# Altium footprint library 00.PcbLib: 150 footprints (part 6 of 10)
Each footprint in its own frame and in the unit in brackets; x right, y up, seen from the top. Pads: shape width x height; smd on the part's side, far side on the other; paste and mask are expansions set on the pad; w line width, h text height; cw(c..) or ccw(c..) is an arc to the next point about the centre after c.
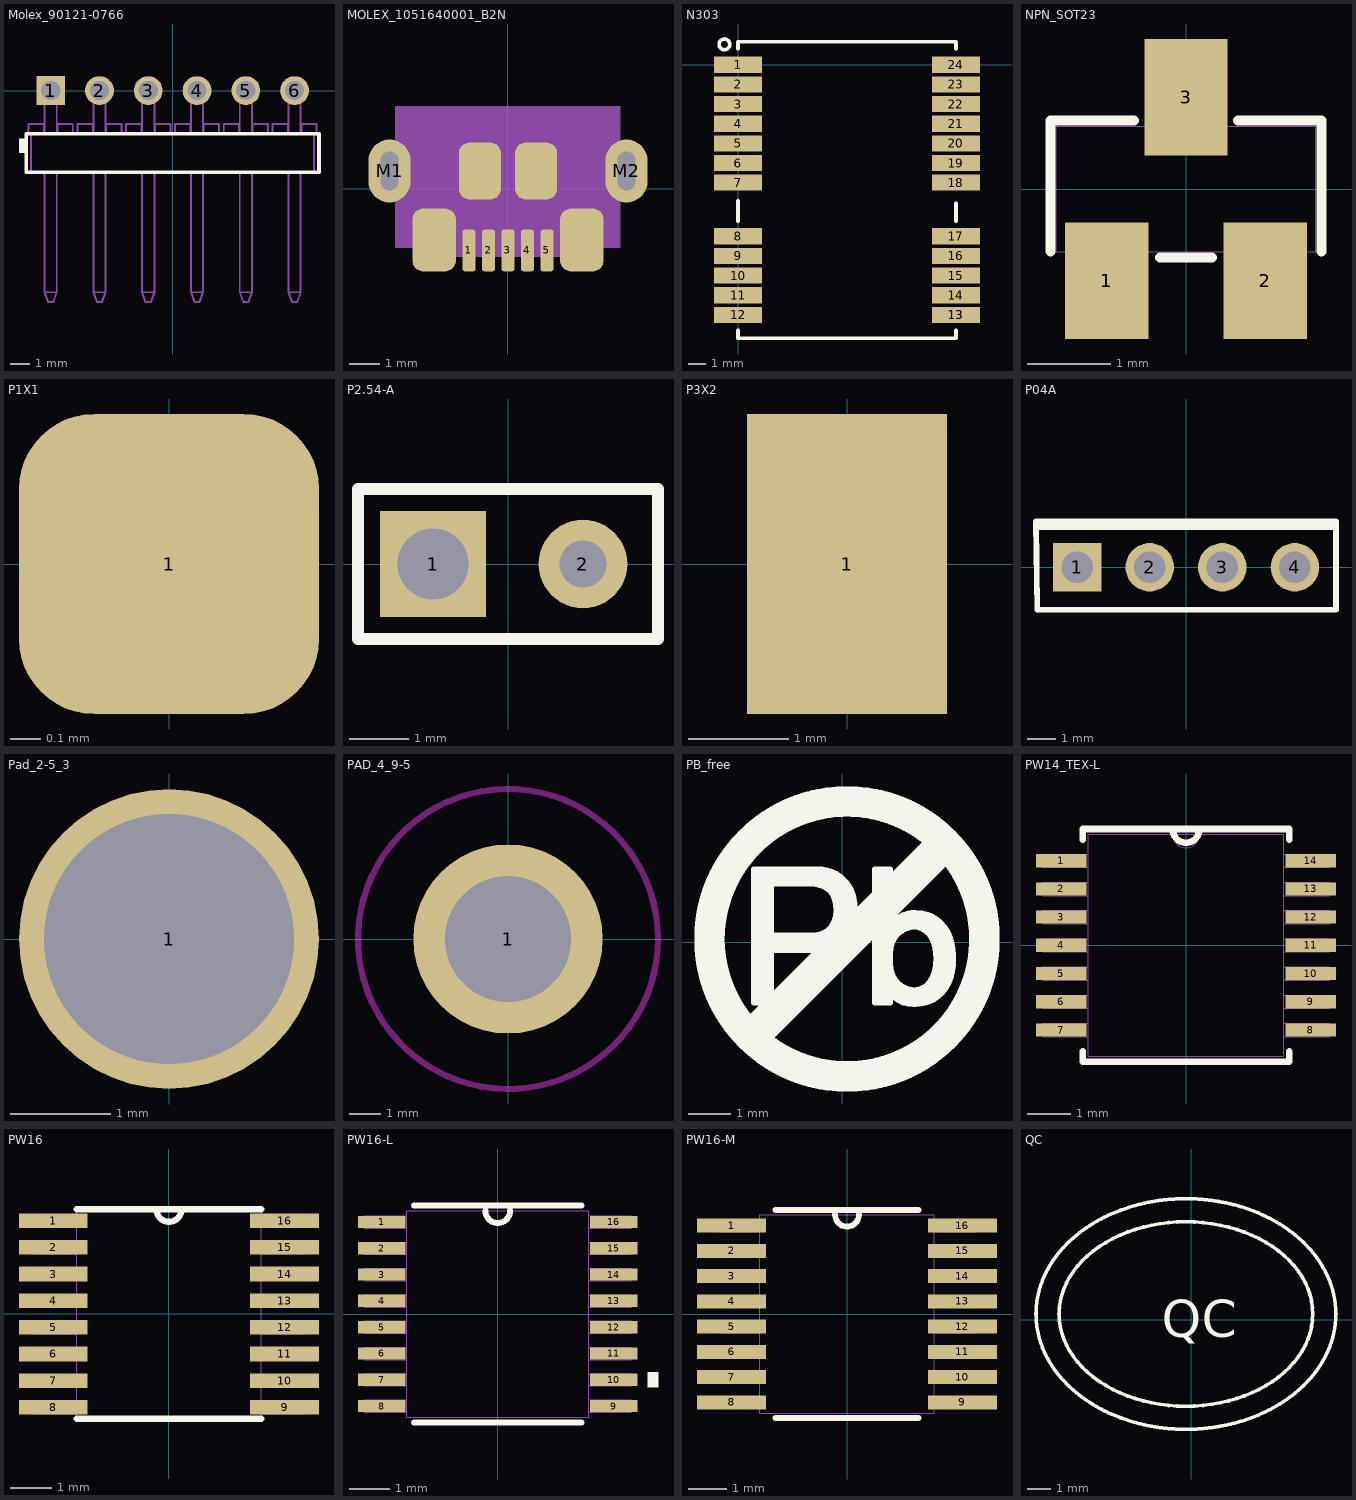
[diagram p5: the footprints below, top view; thin cyan lines are the x and y axes]

## Molex_90121-0766 [mm]
pads (6):
  rect 1.5x1.5 hole 1: 1(-6.35,0)
  round 1.5 hole 1: 2(-3.81,0) 3(-1.27,0) 4(1.27,0) 5(3.81,0) 6(6.35,0)
Top Overlay:
  rectangle: -8,-3.25 -7.62,-2.5
  lines w0.2: -7.62,-4.25 -7.37,-4.25 -5.469,-4.25 -5.175,-4.25 -4.985,-4.25 -4.691,-4.25 -2.929,-4.25 -2.635,-4.25 -2.445,-4.25 -2.151,-4.25 -0.389,-4.25 -0.095,-4.25 0.095,-4.25 0.389,-4.25 2.151,-4.25 2.445,-4.25 2.635,-4.25 2.929,-4.25 4.691,-4.25 4.985,-4.25 5.175,-4.25 5.469,-4.25 7.37,-4.25 7.62,-4.25 7.62,-2.25 -7.62,-2.25 -7.62,-4.25
Top Component Outline (Mech100):
  drawing of 200 lines, arcs and shapes, not listed
3D body "901210766.stp": height 3.63, standoff -2.87, extent -7.62,-11 7.62,0.318

## MOLEX_1051640001_B2N [mm] "MOLEX_1051640001_B2N"
pads (11):
  rrect50% 0.449x1.401 smd: 1(-1.3,-2.05) 2(-0.65,-2.05) 3(0,-2.05) 4(0.65,-2.05) 5(1.3,-2.05)
  oval 1.4x2.1 hole 1.3 slot 0.6 at 0 deg: M1(-3.95,0.6) M2(3.95,0.6)
  rrect50% 1.449x2.101 smd: ""(-2.462,-1.7) ""(2.462,-1.7)
  rrect50% 1.4x1.9 smd: ""(-0.938,0.6) ""(0.938,0.6)
Top 3D Body:
  region: 3.75,0.15 3.75,1.05 4.1,1.05 4.1,0.15
  region: 1.175,-2.4 1.175,-2.25 1.425,-2.25 1.425,-2.4
  region: 0.525,-2.4 0.525,-2.25 0.775,-2.25 0.775,-2.4
  region: -0.125,-2.4 -0.125,-2.25 0.125,-2.25 0.125,-2.4
  region: -0.775,-2.4 -0.775,-2.25 -0.525,-2.25 -0.525,-2.4
  region: -1.425,-2.4 -1.425,-2.25 -1.175,-2.25 -1.175,-2.4
  region: -4.1,0.15 -4.1,1.05 -3.75,1.05 -3.75,0.15
  region: 1.675,-2.25 1.325,-2.25 -1.325,-2.25 -1.675,-2.25 -2.175,-2.25 -2.493,-2.25 -2.846,-2.25 -3,-2.25 -3,-1.95 -3.604,-1.95 -3.75,-1.95 -3.75,2.75 -3.604,2.75 -2.846,2.75 -2.493,2.75 2.493,2.75 2.846,2.75 3.604,2.75 3.75,2.75 3.75,-1.95 3.604,-1.95 3,-1.95 3,-2.25 2.846,-2.25 2.493,-2.25 2.175,-2.25
Top Assembly:
  lines w0.025: -3.75,0.15 -4.012,0.15 -4.1,0.15 -4.1,1.05 -4.012,1.05 -3.75,1.05 ; -3,2.75 -3,-1.95 ; -2.7,-1.95 -2.7,2.75 ; -2.493,-1.95 -2.493,-2.25 ; -2.375,-1.95 -2.375,-1.45 ; -2.175,-1.95 -2.175,-2.25 ; -1.75,-1.45 -1.75,-1.25 ; -1.675,-1.85 -1.325,-1.85 ; -1.425,-2.25 -1.425,-2.4 -1.175,-2.4 -1.175,-2.25 ; -0.775,-2.25 -0.775,-2.4 -0.525,-2.4 -0.525,-2.25 ; -0.125,-2.25 -0.125,-2.4 0.125,-2.4 0.125,-2.25 ; 0.525,-2.25 0.525,-2.4 0.775,-2.4 0.775,-2.25 ; 1.175,-2.25 1.175,-2.4 1.425,-2.4 1.425,-2.25 ; 1.675,-1.85 1.325,-1.85 ; 1.75,-1.45 1.75,-1.25 ; 2.175,-1.95 2.175,-2.25 ; 2.375,-1.95 2.375,-1.45 ; 2.493,-1.95 2.493,-2.25 ; 2.7,-1.95 2.7,2.75 ; 3,2.75 3,-1.95 ; 3.75,0.15 4.012,0.15 4.1,0.15 4.1,1.05 4.012,1.05 3.75,1.05 ; -3,-1.95 -3.604,-1.95 -3.75,-1.95 -3.75,2.75 -3.604,2.75 -2.846,2.75 -2.493,2.75 2.493,2.75 2.846,2.75 3.604,2.75 3.75,2.75 3.75,-1.95 3.604,-1.95 3,-1.95 ; -3,-1.95 -3,-2.25 -2.846,-2.25 -2.493,-2.25 ; -3,-1.95 3,-1.95 ; -2.493,-2.25 -2.175,-2.25 ; -2.375,-1.45 -2.375,-1.35 cw(c-2.275,-1.35) -2.275,-1.25 -1.425,-1.25 cw(c-1.425,-1.35) -1.325,-1.35 -1.325,-1.85 ; -2.375,-1.45 -2.175,-1.45 -1.675,-1.45 -1.675,-2.25 ; -2.175,-2.25 -1.675,-2.25 ; -1.675,-2.25 -1.325,-2.25 ; -1.325,-2.25 1.325,-2.25 ; -1.325,-2.25 -1.325,-1.85 ; 1.325,-2.25 1.675,-2.25 ; 1.325,-2.25 1.325,-1.85 ; 1.325,-1.85 1.325,-1.35 cw(c1.425,-1.35) 1.425,-1.25 2.275,-1.25 cw(c2.275,-1.35) 2.375,-1.35 2.375,-1.45 ; 1.675,-2.25 2.175,-2.25 ; 1.675,-2.25 1.675,-1.45 2.175,-1.45 2.375,-1.45 ; 2.175,-2.25 2.493,-2.25 ; 2.493,-2.25 2.846,-2.25 3,-2.25 3,-1.95 ; -0.5,-1.402 ccw(c-0.4,-1.402) -0.4,-1.502 0.4,-1.502 ccw(c0.4,-1.402) 0.5,-1.402 0.5,-1.002 -0.5,-1.002 -0.5,-1.402
3D body: height 3.81, standoff 0, extent 3.75,0.15 4.1,1.05
3D body: height 3.81, standoff 0, extent 1.175,-2.4 1.425,-2.25
3D body: height 3.81, standoff 0, extent 0.525,-2.4 0.775,-2.25
3D body: height 3.81, standoff 0, extent -0.125,-2.4 0.125,-2.25
3D body: height 3.81, standoff 0, extent -0.775,-2.4 -0.525,-2.25
3D body: height 3.81, standoff 0, extent -1.425,-2.4 -1.175,-2.25
3D body: height 3.81, standoff 0, extent -4.1,0.15 -3.75,1.05
3D body: height 3.81, standoff 0, extent -3.75,-2.25 3.75,2.75

## N303 [mm]
pads (25):
  rect 2.7x0.9 smd: 1(0,0) 2(0,-1.1) 3(0,-2.2) 4(0,-3.3) 5(0,-4.4) 6(0,-5.5) 7(0,-6.6) 8(0,-9.6) 9(0,-10.7) 10(0,-11.8) 11(0,-12.9) 12(0,-14) 13(12.2,-14) 13(12.2,-14) 14(12.2,-12.9) 15(12.2,-11.8) 16(12.2,-10.7) 17(12.2,-9.6) 18(12.2,-6.6) 19(12.2,-5.5) 20(12.2,-4.4) 21(12.2,-3.3) 22(12.2,-2.2) 23(12.2,-1.1) 24(12.2,0)
Top Overlay:
  circle w0.2: c-0.762,1.143 r0.3
  lines w0.2: 0,-14.859 0,-15.3 12.2,-15.3 12.2,-14.867 ; 0,-8.763 0,-7.62 ; 0,0.889 0,1.3 12.2,1.3 12.2,0.897 ; 12.2,-8.763 12.2,-7.747

## NPN_SOT23 [mm]
pads (3):
  rect 1x1.4 smd mask+0.05: 1(-0.95,-1.1) 2(0.95,-1.1) 3(0,1.1)
Top Overlay:
  lines w0.12: -1.625,-0.75 -1.625,0.825 -0.624,0.825 ; -0.312,-0.825 0.312,-0.825 ; 0.624,0.825 1.625,0.825 1.625,-0.75
Bottom 3D Body:
  lines w0.01: -1.56,-0.75 -1.56,0.75 1.56,0.75 1.56,-0.75 -1.56,-0.75 ; -1.275,-1.025 -0.675,-1.025 -0.675,-0.75 -1.275,-0.75 -1.275,-1.025 ; -0.25,0.75 0.325,0.75 0.325,1.05 -0.25,1.05 -0.25,0.75 ; 0.65,-1.025 1.25,-1.025 1.25,-0.75 0.65,-0.75 0.65,-1.025
3D body: height 1.1, standoff 0, extent -1.559,-0.749 1.559,0.749
3D body "SOT23-3_TO-236AB.STEP": height 1.09, standoff 0, extent -1.5,-1.25 1.5,1.25

## P1X1 [mm]
pads (1):
  rrect50% 1x1 smd: 1(0,0)

## P2.54-A [mm]
pads (2):
  rect 1.8x1.8 hole 1.2: 1(-1.27,0)
  round 1.5 hole 0.8: 2(1.27,0)
Top Overlay:
  lines w0.2: -2.54,-1.27 -2.54,1.27 2.54,1.27 2.54,-1.27 -2.54,-1.27

## P3X2 [mm]
pads (1):
  rect 2x3 smd: 1(0,0)

## P04A [mm]
pads (4):
  rect 1.7x1.7 hole 1.1: 1(-3.81,0)
  round 1.7 hole 1.1: 2(-1.27,0) 3(1.27,0) 4(3.81,0)
Top Overlay:
  rectangle: -5.25,1.311 5.25,1.711
  lines w0.2: -5.25,1.6 -5.206,-1.484 -2.625,-1.484 2.625,-1.484 5.25,-1.484 5.25,1.6

## Pad_2-5_3 [mm]
pads (1):
  round 3 hole 2.5: 1(0,0)

## PAD_4_9-5 [mm]
pads (1):
  round 6 hole 4 unplated: 1(0,0)
Keep-Out Layer:
  circle w0.2: c0,0 r4.75

## PB_free [mm]
Top Overlay:
  drawing of 3240 lines, arcs and shapes, not listed

## PW14_TEX-L [mil]
pads (14):
  rect 46x12 smd paste+0 mask+0: 1(-113,76.77) 2(-113,51.18) 3(-113,25.59) 4(-113,0) 5(-113,-25.59) 6(-113,-51.18) 7(-113,-76.77) 8(113,-76.77) 9(113,-51.18) 10(113,-25.59) 11(113,0) 12(113,25.59) 13(113,51.18) 14(113,76.77)
Top Overlay:
  lines w5.98: -12,105 ccw(c0,105) 12,105
  lines w6: -93.5,-95.87 -93.5,-105.5 93.5,-105.5 93.5,-95.87 ; -93.5,95.87 -93.5,105.5 93.5,105.5 93.5,95.87
Top Component Outline (Mech100):
  lines w0: -12,100.5 ccw(c0,100.5) 12,100.5
  lines w1: -130,-82.77 -88.5,-82.77 -88.5,-70.77 -130,-70.77 -130,-82.77 ; -130,-57.18 -88.5,-57.18 -88.5,-45.18 -130,-45.18 -130,-57.18 ; -130,-31.59 -88.5,-31.59 -88.5,-19.59 -130,-19.59 -130,-31.59 ; -130,-6 -88.5,-6 -88.5,6 -130,6 -130,-6 ; -130,19.59 -88.5,19.59 -88.5,31.59 -130,31.59 -130,19.59 ; -130,45.18 -88.5,45.18 -88.5,57.18 -130,57.18 -130,45.18 ; -130,70.77 -88.5,70.77 -88.5,82.77 -130,82.77 -130,70.77 ; -88.5,-100.5 -88.5,100.5 88.5,100.5 88.5,-100.5 -88.5,-100.5 ; 88.5,-82.77 130,-82.77 130,-70.77 88.5,-70.77 88.5,-82.77 ; 88.5,-57.18 130,-57.18 130,-45.18 88.5,-45.18 88.5,-57.18 ; 88.5,-31.59 130,-31.59 130,-19.59 88.5,-19.59 88.5,-31.59 ; 88.5,-6 130,-6 130,6 88.5,6 88.5,-6 ; 88.5,19.59 130,19.59 130,31.59 88.5,31.59 88.5,19.59 ; 88.5,45.18 130,45.18 130,57.18 88.5,57.18 88.5,45.18 ; 88.5,70.77 130,70.77 130,82.77 88.5,82.77 88.5,70.77
3D body "PW14_TEX.step": height 47.09, standoff 0, extent -129.99,-100.5 130.01,100.52

## PW16 [mil]
pads (16):
  rect 66x14 smd: 1(-111,89.57) 2(-111,63.98) 3(-111,38.39) 4(-111,12.8) 5(-111,-12.8) 6(-111,-38.39) 7(-111,-63.98) 8(-111,-89.57) 9(111,-89.57) 10(111,-63.98) 11(111,-38.39) 12(111,-12.8) 13(111,12.8) 14(111,38.39) 15(111,63.98) 16(111,89.57)
Top Overlay:
  lines w6: -88.5,-100.5 88.5,-100.5 ; -88.5,100.5 88.5,100.5 ; -12,100.5 ccw(c0,100.5) 12,100.5
Top Component Outline (Mech100):
  lines w0: -12,100.5 ccw(c0,100.5) 12,100.5
  lines w1: -130,-95.57 -88.5,-95.57 -88.5,-83.57 -130,-83.57 -130,-95.57 ; -130,-69.98 -88.5,-69.98 -88.5,-57.98 -130,-57.98 -130,-69.98 ; -130,-44.39 -88.5,-44.39 -88.5,-32.39 -130,-32.39 -130,-44.39 ; -130,-18.8 -88.5,-18.8 -88.5,-6.8 -130,-6.8 -130,-18.8 ; -130,6.8 -88.5,6.8 -88.5,18.8 -130,18.8 -130,6.8 ; -130,32.39 -88.5,32.39 -88.5,44.39 -130,44.39 -130,32.39 ; -130,57.98 -88.5,57.98 -88.5,69.98 -130,69.98 -130,57.98 ; -130,83.57 -88.5,83.57 -88.5,95.57 -130,95.57 -130,83.57 ; -88.5,-100.5 -88.5,100.5 88.5,100.5 88.5,-100.5 -88.5,-100.5 ; 88.5,-95.57 130,-95.57 130,-83.57 88.5,-83.57 88.5,-95.57 ; 88.5,-69.98 130,-69.98 130,-57.98 88.5,-57.98 88.5,-69.98 ; 88.5,-44.39 130,-44.39 130,-32.39 88.5,-32.39 88.5,-44.39 ; 88.5,-18.8 130,-18.8 130,-6.8 88.5,-6.8 88.5,-18.8 ; 88.5,6.8 130,6.8 130,18.8 88.5,18.8 88.5,6.8 ; 88.5,32.39 130,32.39 130,44.39 88.5,44.39 88.5,32.39 ; 88.5,57.98 130,57.98 130,69.98 88.5,69.98 88.5,57.98 ; 88.5,83.57 130,83.57 130,95.57 88.5,95.57 88.5,83.57
3D body "PW16.step": height 47.09, standoff 0, extent -130,-100.51 130,100.51

## PW16-L [mil]
pads (16):
  rect 46x12 smd paste+0 mask+0: 1(-113,89.57) 2(-113,63.98) 3(-113,38.39) 4(-113,12.8) 5(-113,-12.8) 6(-113,-38.39) 7(-113,-63.98) 8(-113,-89.57) 9(113,-89.57) 10(113,-63.98) 11(113,-38.39) 12(113,-12.8) 13(113,12.8) 14(113,38.39) 15(113,63.98) 16(113,89.57)
Top Overlay:
  region: 146,-56.48 156,-56.48 156,-71.48 146,-71.48
  lines w5.91: -12,100.5 ccw(c0,100.5) 12,100.5
  lines w6: -81.46,-105.5 81.46,-105.5 ; -81.46,105.5 81.46,105.5
Top Component Outline (Mech100):
  lines w0: -12,100.5 ccw(c0,100.5) 12,100.5
  lines w1: -130,-95.57 -88.5,-95.57 -88.5,-83.57 -130,-83.57 -130,-95.57 ; -130,-69.98 -88.5,-69.98 -88.5,-57.98 -130,-57.98 -130,-69.98 ; -130,-44.39 -88.5,-44.39 -88.5,-32.39 -130,-32.39 -130,-44.39 ; -130,-18.8 -88.5,-18.8 -88.5,-6.8 -130,-6.8 -130,-18.8 ; -130,6.8 -88.5,6.8 -88.5,18.8 -130,18.8 -130,6.8 ; -130,32.39 -88.5,32.39 -88.5,44.39 -130,44.39 -130,32.39 ; -130,57.98 -88.5,57.98 -88.5,69.98 -130,69.98 -130,57.98 ; -130,83.57 -88.5,83.57 -88.5,95.57 -130,95.57 -130,83.57 ; -88.5,-100.5 -88.5,100.5 88.5,100.5 88.5,-100.5 -88.5,-100.5 ; 88.5,-95.57 130,-95.57 130,-83.57 88.5,-83.57 88.5,-95.57 ; 88.5,-69.98 130,-69.98 130,-57.98 88.5,-57.98 88.5,-69.98 ; 88.5,-44.39 130,-44.39 130,-32.39 88.5,-32.39 88.5,-44.39 ; 88.5,-18.8 130,-18.8 130,-6.8 88.5,-6.8 88.5,-18.8 ; 88.5,6.8 130,6.8 130,18.8 88.5,18.8 88.5,6.8 ; 88.5,32.39 130,32.39 130,44.39 88.5,44.39 88.5,32.39 ; 88.5,57.98 130,57.98 130,69.98 88.5,69.98 88.5,57.98 ; 88.5,83.57 130,83.57 130,95.57 88.5,95.57 88.5,83.57
3D body "PW16-L.step": height 47.09, standoff 0, extent -130,-100.51 130,100.51
3D body: height 10, standoff -531.5, extent -110,105 -110,105

## PW16-M [mil]
pads (16):
  rect 70x14 smd paste+0 mask+0: 1(-117,89.57) 2(-117,63.98) 3(-117,38.39) 4(-117,12.8) 5(-117,-12.8) 6(-117,-38.39) 7(-117,-63.98) 8(-117,-89.57) 9(117,-89.57) 10(117,-63.98) 11(117,-38.39) 12(117,-12.8) 13(117,12.8) 14(117,38.39) 15(117,63.98) 16(117,89.57)
Top Overlay:
  lines w5.91: -12,100.5 ccw(c0,100.5) 12,100.5
  lines w6: -72.42,-105.5 72.42,-105.5 ; -72.42,105.5 72.42,105.5
Top Component Outline (Mech100):
  lines w0.98: -12,100.5 ccw(c0,100.5) 12,100.5
  lines w1: -130,-95.57 -130,-83.57 -88.5,-83.57 -88.5,-95.57 -130,-95.57 ; -130,-69.98 -130,-57.98 -88.5,-57.98 -88.5,-69.98 -130,-69.98 ; -130,-44.39 -130,-32.39 -88.5,-32.39 -88.5,-44.39 -130,-44.39 ; -130,-18.8 -130,-6.8 -88.5,-6.8 -88.5,-18.8 -130,-18.8 ; -130,6.8 -130,18.8 -88.5,18.8 -88.5,6.8 -130,6.8 ; -130,32.39 -130,44.39 -88.5,44.39 -88.5,32.39 -130,32.39 ; -130,57.98 -130,69.98 -88.5,69.98 -88.5,57.98 -130,57.98 ; -130,83.57 -130,95.57 -88.5,95.57 -88.5,83.57 -130,83.57 ; -88.5,-100.5 88.5,-100.5 88.5,100.5 -88.5,100.5 -88.5,-100.5 ; 88.5,-95.57 88.5,-83.57 130,-83.57 130,-95.57 88.5,-95.57 ; 88.5,-69.98 88.5,-57.98 130,-57.98 130,-69.98 88.5,-69.98 ; 88.5,-44.39 88.5,-32.39 130,-32.39 130,-44.39 88.5,-44.39 ; 88.5,-18.8 88.5,-6.8 130,-6.8 130,-18.8 88.5,-18.8 ; 88.5,6.8 88.5,18.8 130,18.8 130,6.8 88.5,6.8 ; 88.5,32.39 88.5,44.39 130,44.39 130,32.39 88.5,32.39 ; 88.5,57.98 88.5,69.98 130,69.98 130,57.98 88.5,57.98 ; 88.5,83.57 88.5,95.57 130,95.57 130,83.57 88.5,83.57
3D body "PW16-M.step": height 47.09, standoff 0, extent -130,-100.51 130,100.51

## QC [mm]
Top Overlay:
  drawing of 911 lines, arcs and shapes, not listed
  text "QC" at -1.27,-0.762 h1.6